# Altium schematic symbol library IC_ADI.SCHLIB: 3169 symbols (part 56 of 181) (continued)
## AD7533JP (continued)
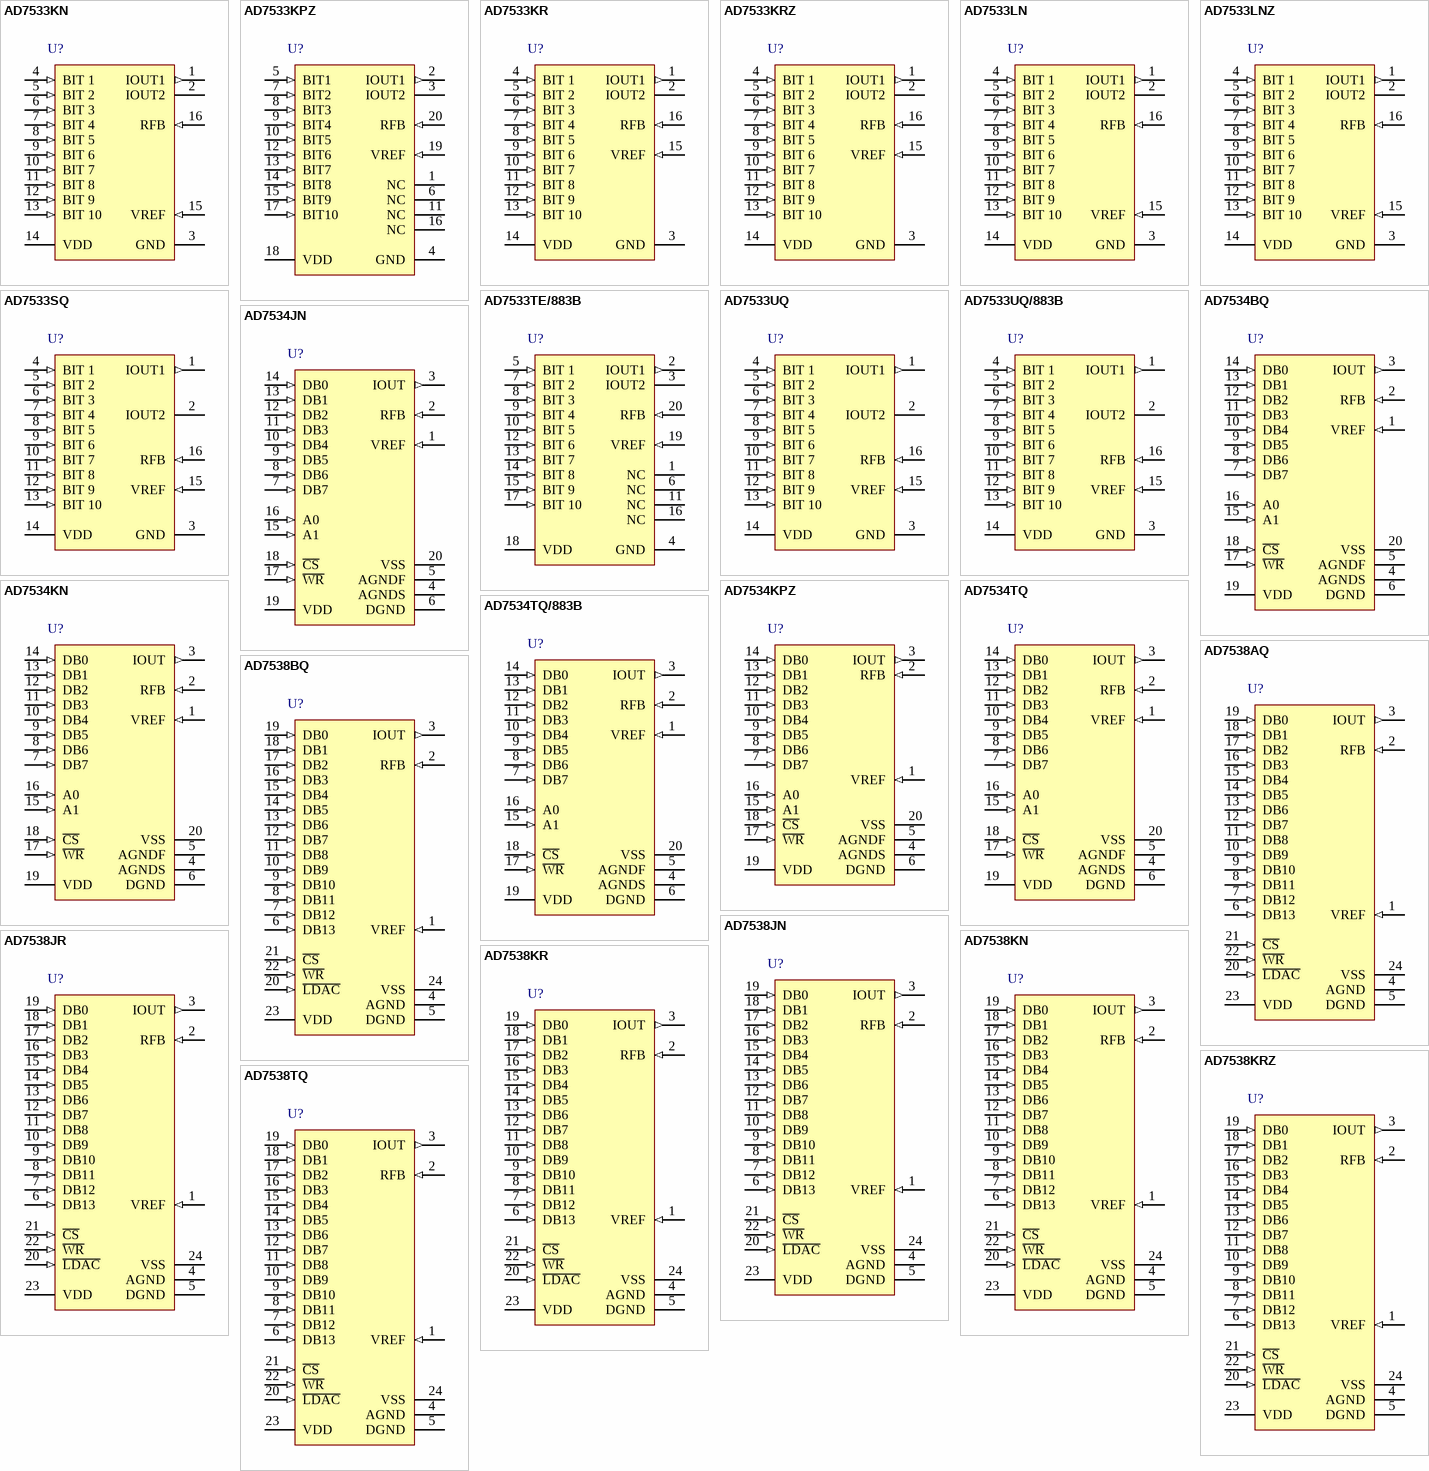
[diagram p47: symbols AD7533KN to AD7538TQ]

## AD7533KN
designator U?
Single 10-Bit CMOS Digital-to-Analog Converter, 0 to +70 degC, N-16, Tube; Generic Part Number: AD7533; PartNumber: AD7533KN; # DAC Outputs: 1; Max V+: 16.5V; Op Pwr Diss: 30mW; Resolution (Bits): 10; Settling Time: 600ns; Single Supply: Yes; DatasheetVersion: Rev.C; PackageVersion: 070706-A; PackageReference: N-16; PackageDescription: 16-Lead Plastic Dual In-Line Package [PDIP] Narrow Body; Supplier Part Number 1: AD7533KN-ND; Supplier Part Number 2: 584-AD7533KN; Packing: Tube; RoHS: N; Mounting Technology: Through Hole; Code_JEDEC: MS-001; ComponentLink1Description: Manufacturer URL; ComponentLink2Description: Datasheet; ComponentLink3Description: Package Specification; ComponentLink4Description: Product URL
footprint DIP16 (Footprint not found)
pins: 1 IOUT1 (out) "DAC Current Output.", 2 IOUT2 "DAC Analog Ground. This pin should normally be tied to the analog ground of the system.", 3 GND (power) "Ground.", 4 BIT 1 (in) "MSB to LSB.", 5 BIT 2 (in) "MSB to LSB.", 6 BIT 3 (in) "MSB to LSB.", 7 BIT 4 (in) "MSB to LSB.", 8 BIT 5 (in) "MSB to LSB.", 9 BIT 6 (in) "MSB to LSB.", 10 BIT 7 (in) "MSB to LSB.", 11 BIT 8 (in) "MSB to LSB.", 12 BIT 9 (in) "MSB to LSB.", 13 BIT 10 (in) "MSB to LSB.", 14 VDD (power) "Positive Power Supply Input. These parts can be operated from a supply of 5 V to 16 V.", 15 VREF (in) "DAC Reference Voltage Input Terminal.", 16 RFB (in) "DAC Feedback Resistor Pin. Establish voltage output for the DAC by connecting RFB to external amplifier output."

## AD7533KPZ
designator U?
Single 10-Bit CMOS Digital-to-Analog Converter, 0 to +70 degC, P-20A, Pb-Free, Tube; Generic Part Number: AD7533; PartNumber: AD7533KPZ; # DAC Outputs: 1; Max V+: 16.5V; Op Pwr Diss: 30mW; Resolution (Bits): 10; Settling Time: 600ns; Single Supply: Yes; DatasheetVersion: Rev.C; PackageVersion: Nov-2002; PackageReference: P-20A; PackageDescription: 20-Lead Plastic Leaded Chip Carrier [PLCC]; Supplier Part Number 1: AD7533KPZ-ND; Supplier Part Number 2: 584-AD7533KPZ; Packing: Tube; RoHS: Y; Mounting Technology: Surface Mount; Code_JEDEC: MO-047-AA; ComponentLink1Description: Manufacturer URL; ComponentLink2Description: Datasheet; ComponentLink3Description: Package Specification; ComponentLink4Description: Product URL
footprint PLCC-20N (Footprint not found)
pins: 1 NC "No Connect.", 2 IOUT1 (out) "DAC Current Output.", 3 IOUT2 "DAC Analog Ground. This pin should normally be tied to the analog ground of the system.", 4 GND (power) "Ground.", 5 BIT1 (in) "MSB to LSB.", 6 NC "No Connect.", 7 BIT2 (in) "MSB to LSB.", 8 BIT3 (in) "MSB to LSB.", 9 BIT4 (in) "MSB to LSB.", 10 BIT5 (in) "MSB to LSB.", 11 NC "No Connect.", 12 BIT6 (in) "MSB to LSB.", 13 BIT7 (in) "MSB to LSB.", 14 BIT8 (in) "MSB to LSB.", 15 BIT9 (in) "MSB to LSB.", 16 NC "No Connect.", 17 BIT10 (in) "MSB to LSB.", 18 VDD (power) "Positive Power Supply Input. These parts can be operated from a supply of 5 V to 16 V.", 19 VREF (in) "DAC Reference Voltage Input Terminal.", 20 RFB (in) "DAC Feedback Resistor Pin. Establish voltage output for the DAC by connecting RFB to external amplifier output."

## AD7533KR
designator U?
Single 10-Bit CMOS Digital-to-Analog Converter, 0 to +70 degC, RW-16, Tube; Generic Part Number: AD7533; PartNumber: AD7533KR; # DAC Outputs: 1; Max V+: 16.5V; Op Pwr Diss: 30mW; Resolution (Bits): 10; Settling Time: 600ns; Single Supply: Yes; DatasheetVersion: Rev.C; PackageVersion: 032707-B; PackageReference: RW-16; PackageDescription: 16-Lead Standard Small Outline Package [SOIC_W]; Supplier Part Number 1: AD7533KR-ND; Supplier Part Number 2: 584-AD7533KR; Packing: Tube; RoHS: N; Mounting Technology: Surface Mount; Code_JEDEC: MS-013-AA; Code_IPC: SOIC127P1030-16; ComponentLink1Description: Manufacturer URL; ComponentLink2Description: Datasheet; ComponentLink3Description: Package Specification; ComponentLink4Description: Product URL
footprint SOIC16W_1.27 (Footprint not found)
pins: 1 IOUT1 (out) "DAC Current Output.", 2 IOUT2 "DAC Analog Ground. This pin should normally be tied to the analog ground of the system.", 3 GND (power) "Ground.", 4 BIT 1 (in) "MSB to LSB.", 5 BIT 2 (in) "MSB to LSB.", 6 BIT 3 (in) "MSB to LSB.", 7 BIT 4 (in) "MSB to LSB.", 8 BIT 5 (in) "MSB to LSB.", 9 BIT 6 (in) "MSB to LSB.", 10 BIT 7 (in) "MSB to LSB.", 11 BIT 8 (in) "MSB to LSB.", 12 BIT 9 (in) "MSB to LSB.", 13 BIT 10 (in) "MSB to LSB.", 14 VDD (power) "Positive Power Supply Input. These parts can be operated from a supply of 5 V to 16 V.", 15 VREF (in) "DAC Reference Voltage Input Terminal.", 16 RFB (in) "DAC Feedback Resistor Pin. Establish voltage output for the DAC by connecting RFB to external amplifier output."

## AD7533KRZ
designator U?
Single 10-Bit CMOS Digital-to-Analog Converter, 0 to +70 degC, RW-16, Pb-Free, Tube; Generic Part Number: AD7533; PartNumber: AD7533KRZ; # DAC Outputs: 1; Max V+: 16.5V; Op Pwr Diss: 30mW; Resolution (Bits): 10; Settling Time: 600ns; Single Supply: Yes; DatasheetVersion: Rev.C; PackageVersion: 032707-B; PackageReference: RW-16; PackageDescription: 16-Lead Standard Small Outline Package [SOIC_W]; Supplier Part Number 1: AD7533KRZ-ND; Supplier Part Number 2: 88H0005; Supplier Part Number 3: 584-AD7533KRZ; Packing: Tube; RoHS: Y; Mounting Technology: Surface Mount; Code_JEDEC: MS-013-AA; Code_IPC: SOIC127P1030-16; ComponentLink1Description: Manufacturer URL; ComponentLink2Description: Datasheet; ComponentLink3Description: Package Specification; ComponentLink4Description: Product URL
footprint SOIC16W_1.27 (Footprint not found)
pins: 1 IOUT1 (out) "DAC Current Output.", 2 IOUT2 "DAC Analog Ground. This pin should normally be tied to the analog ground of the system.", 3 GND (power) "Ground.", 4 BIT 1 (in) "MSB to LSB.", 5 BIT 2 (in) "MSB to LSB.", 6 BIT 3 (in) "MSB to LSB.", 7 BIT 4 (in) "MSB to LSB.", 8 BIT 5 (in) "MSB to LSB.", 9 BIT 6 (in) "MSB to LSB.", 10 BIT 7 (in) "MSB to LSB.", 11 BIT 8 (in) "MSB to LSB.", 12 BIT 9 (in) "MSB to LSB.", 13 BIT 10 (in) "MSB to LSB.", 14 VDD (power) "Positive Power Supply Input. These parts can be operated from a supply of 5 V to 16 V.", 15 VREF (in) "DAC Reference Voltage Input Terminal.", 16 RFB (in) "DAC Feedback Resistor Pin. Establish voltage output for the DAC by connecting RFB to external amplifier output."

## AD7533LN
designator U?
Single 10-Bit CMOS Digital-to-Analog Converter, 0 to +70 degC, N-16, Tube; Generic Part Number: AD7533; PartNumber: AD7533LN; # DAC Outputs: 1; Max V+: 16.5V; Op Pwr Diss: 30mW; Resolution (Bits): 10; Settling Time: 600ns; Single Supply: Yes; DatasheetVersion: Rev.C; PackageVersion: 070706-A; PackageReference: N-16; PackageDescription: 16-Lead Plastic Dual In-Line Package [PDIP] Narrow Body; Supplier Part Number 1: AD7533LN-ND; Supplier Part Number 2: 584-AD7533LN; Packing: Tube; RoHS: N; Mounting Technology: Through Hole; Code_JEDEC: MS-001; ComponentLink1Description: Manufacturer URL; ComponentLink2Description: Datasheet; ComponentLink3Description: Package Specification; ComponentLink4Description: Product URL
footprint DIP16 (Footprint not found)
pins: 1 IOUT1 (out) "DAC Current Output.", 2 IOUT2 "DAC Analog Ground. This pin should normally be tied to the analog ground of the system.", 3 GND (power) "Ground.", 4 BIT 1 (in) "MSB to LSB.", 5 BIT 2 (in) "MSB to LSB.", 6 BIT 3 (in) "MSB to LSB.", 7 BIT 4 (in) "MSB to LSB.", 8 BIT 5 (in) "MSB to LSB.", 9 BIT 6 (in) "MSB to LSB.", 10 BIT 7 (in) "MSB to LSB.", 11 BIT 8 (in) "MSB to LSB.", 12 BIT 9 (in) "MSB to LSB.", 13 BIT 10 (in) "MSB to LSB.", 14 VDD (power) "Positive Power Supply Input. These parts can be operated from a supply of 5 V to 16 V.", 15 VREF (in) "DAC Reference Voltage Input Terminal.", 16 RFB (in) "DAC Feedback Resistor Pin. Establish voltage output for the DAC by connecting RFB to external amplifier output."

## AD7533LNZ
designator U?
Single 10-Bit CMOS Digital-to-Analog Converter, 0 to +70 degC, N-16, Pb-Free, Tube; Generic Part Number: AD7533; PartNumber: AD7533LNZ; # DAC Outputs: 1; Max V+: 16.5V; Op Pwr Diss: 30mW; Resolution (Bits): 10; Settling Time: 600ns; Single Supply: Yes; DatasheetVersion: Rev.C; PackageVersion: 070706-A; PackageReference: N-16; PackageDescription: 16-Lead Plastic Dual In-Line Package [PDIP] Narrow Body; Supplier Part Number 1: AD7533LNZ-ND; Supplier Part Number 2: 59K4981; Packing: Tube; RoHS: Y; Mounting Technology: Through Hole; Code_JEDEC: MS-001; ComponentLink1Description: Manufacturer URL; ComponentLink2Description: Datasheet; ComponentLink3Description: Package Specification; ComponentLink4Description: Product URL
footprint DIP16 (Footprint not found)
pins: 1 IOUT1 (out) "DAC Current Output.", 2 IOUT2 "DAC Analog Ground. This pin should normally be tied to the analog ground of the system.", 3 GND (power) "Ground.", 4 BIT 1 (in) "MSB to LSB.", 5 BIT 2 (in) "MSB to LSB.", 6 BIT 3 (in) "MSB to LSB.", 7 BIT 4 (in) "MSB to LSB.", 8 BIT 5 (in) "MSB to LSB.", 9 BIT 6 (in) "MSB to LSB.", 10 BIT 7 (in) "MSB to LSB.", 11 BIT 8 (in) "MSB to LSB.", 12 BIT 9 (in) "MSB to LSB.", 13 BIT 10 (in) "MSB to LSB.", 14 VDD (power) "Positive Power Supply Input. These parts can be operated from a supply of 5 V to 16 V.", 15 VREF (in) "DAC Reference Voltage Input Terminal.", 16 RFB (in) "DAC Feedback Resistor Pin. Establish voltage output for the DAC by connecting RFB to external amplifier output."

## AD7533SQ
designator U?
Single 10-Bit CMOS Digital-to-Analog Converter, -55 to +125 degC, Q-16, Tube; Generic Part Number: AD7533; PartNumber: AD7533SQ; # DAC Outputs: 1; Max V+: 16.5V; Op Pwr Diss: 30mW; Resolution (Bits): 10; Settling Time: 600ns; Single Supply: Yes; DatasheetVersion: Rev.C; PackageVersion: 1996; PackageReference: Q-16; PackageDescription: DIP, 16-Pin, Skinny Dual In-line Package, 300mil Wide, Pitch 2.54 mm; Supplier Part Number 1: AD7533SQ-ND; Supplier Part Number 2: 16F3381; Supplier Part Number 3: 584-AD7533SQ; Packing: Tube; RoHS: N; Mounting Technology: Through Hole; ComponentLink1Description: Manufacturer URL; ComponentLink2Description: Datasheet; ComponentLink3Description: Package Specification; ComponentLink4Description: Product URL
footprint DIP16 (Footprint not found)
pins: 1 IOUT1 (out) "DAC Current Output.", 2 IOUT2 "DAC Analog Ground. This pin should normally be tied to the analog ground of the system.", 3 GND (power) "Ground.", 4 BIT 1 (in) "MSB to LSB.", 5 BIT 2 (in) "MSB to LSB.", 6 BIT 3 (in) "MSB to LSB.", 7 BIT 4 (in) "MSB to LSB.", 8 BIT 5 (in) "MSB to LSB.", 9 BIT 6 (in) "MSB to LSB.", 10 BIT 7 (in) "MSB to LSB.", 11 BIT 8 (in) "MSB to LSB.", 12 BIT 9 (in) "MSB to LSB.", 13 BIT 10 (in) "MSB to LSB.", 14 VDD (power) "Positive Power Supply Input. These parts can be operated from a supply of 5 V to 16 V.", 15 VREF (in) "DAC Reference Voltage Input Terminal.", 16 RFB (in) "DAC Feedback Resistor Pin. Establish voltage output for the DAC by connecting RFB to external amplifier output."

## AD7533TE/883B
designator U?
Single 10-Bit CMOS Digital-to-Analog Converter, -55 to +125 degC, E-20-1, Tube; Generic Part Number: AD7533; PartNumber: AD7533TE/883B; # DAC Outputs: 1; Max V+: 16.5V; Op Pwr Diss: 30mW; Resolution (Bits): 10; Settling Time: 600ns; Single Supply: Yes; DatasheetVersion: Rev.C; PackageVersion: 022106-A; PackageReference: E-20-1; PackageDescription: 20-Terminal Ceramic Leadless Chip Carrier [LCC]; Supplier Part Number 1: 584-AD7533TE883B; Packing: Tube; RoHS: N; Mounting Technology: Surface Mount; ComponentLink1Description: Manufacturer URL; ComponentLink2Description: Datasheet; ComponentLink3Description: Package Specification; ComponentLink4Description: Product URL
footprint PLCC-20N (Footprint not found)
pins: 1 NC "No Connect.", 2 IOUT1 (out) "DAC Current Output.", 3 IOUT2 "DAC Analog Ground. This pin should normally be tied to the analog ground of the system.", 4 GND (power) "Ground.", 5 BIT 1 (in) "MSB to LSB.", 6 NC "No Connect.", 7 BIT 2 (in) "MSB to LSB.", 8 BIT 3 (in) "MSB to LSB.", 9 BIT 4 (in) "MSB to LSB.", 10 BIT 5 (in) "MSB to LSB.", 11 NC "No Connect.", 12 BIT 6 (in) "MSB to LSB.", 13 BIT 7 (in) "MSB to LSB.", 14 BIT 8 (in) "MSB to LSB.", 15 BIT 9 (in) "MSB to LSB.", 16 NC "No Connect.", 17 BIT 10 (in) "MSB to LSB.", 18 VDD (power) "Positive Power Supply Input. These parts can be operated from a supply of 5 V to 16 V.", 19 VREF (in) "DAC Reference Voltage Input Terminal.", 20 RFB (in) "DAC Feedback Resistor Pin. Establish voltage output for the DAC by connecting RFB to external amplifier output."

## AD7533UQ
designator U?
Single 10-Bit CMOS Digital-to-Analog Converter, -55 to +125 degC, Q-16, Tube; Generic Part Number: AD7533; PartNumber: AD7533UQ; # DAC Outputs: 1; Max V+: 16.5V; Op Pwr Diss: 30mW; Resolution (Bits): 10; Settling Time: 600ns; Single Supply: Yes; DatasheetVersion: Rev.C; PackageVersion: 1996; PackageReference: Q-16; PackageDescription: DIP, 16-Pin, Skinny Dual In-line Package, 300mil Wide, Pitch 2.54 mm; Supplier Part Number 1: AD7533UQ-ND; Supplier Part Number 2: 16F3383; Supplier Part Number 3: 584-AD7533UQ; Packing: Tube; RoHS: N; Mounting Technology: Through Hole; ComponentLink1Description: Manufacturer URL; ComponentLink2Description: Datasheet; ComponentLink3Description: Package Specification; ComponentLink4Description: Product URL
footprint DIP16 (Footprint not found)
pins: 1 IOUT1 (out) "DAC Current Output.", 2 IOUT2 "DAC Analog Ground. This pin should normally be tied to the analog ground of the system.", 3 GND (power) "Ground.", 4 BIT 1 (in) "MSB to LSB.", 5 BIT 2 (in) "MSB to LSB.", 6 BIT 3 (in) "MSB to LSB.", 7 BIT 4 (in) "MSB to LSB.", 8 BIT 5 (in) "MSB to LSB.", 9 BIT 6 (in) "MSB to LSB.", 10 BIT 7 (in) "MSB to LSB.", 11 BIT 8 (in) "MSB to LSB.", 12 BIT 9 (in) "MSB to LSB.", 13 BIT 10 (in) "MSB to LSB.", 14 VDD (power) "Positive Power Supply Input. These parts can be operated from a supply of 5 V to 16 V.", 15 VREF (in) "DAC Reference Voltage Input Terminal.", 16 RFB (in) "DAC Feedback Resistor Pin. Establish voltage output for the DAC by connecting RFB to external amplifier output."

## AD7533UQ/883B
designator U?
Single 10-Bit CMOS Digital-to-Analog Converter, -55 to +125 degC, Q-16, Tube; Generic Part Number: AD7533; PartNumber: AD7533UQ/883B; # DAC Outputs: 1; Max V+: 16.5V; Op Pwr Diss: 30mW; Resolution (Bits): 10; Settling Time: 600ns; Single Supply: Yes; DatasheetVersion: Rev.C; PackageVersion: 1996; PackageReference: Q-16; PackageDescription: DIP, 16-Pin, Skinny Dual In-line Package, 300mil Wide, Pitch 2.54 mm; Supplier Part Number 1: 30M2244; Supplier Part Number 2: 584-AD7533UQ883B; Packing: Tube; RoHS: N; Mounting Technology: Through Hole; ComponentLink1Description: Manufacturer URL; ComponentLink2Description: Datasheet; ComponentLink3Description: Package Specification; ComponentLink4Description: Product URL
footprint DIP16 (Footprint not found)
pins: 1 IOUT1 (out) "DAC Current Output.", 2 IOUT2 "DAC Analog Ground. This pin should normally be tied to the analog ground of the system.", 3 GND (power) "Ground.", 4 BIT 1 (in) "MSB to LSB.", 5 BIT 2 (in) "MSB to LSB.", 6 BIT 3 (in) "MSB to LSB.", 7 BIT 4 (in) "MSB to LSB.", 8 BIT 5 (in) "MSB to LSB.", 9 BIT 6 (in) "MSB to LSB.", 10 BIT 7 (in) "MSB to LSB.", 11 BIT 8 (in) "MSB to LSB.", 12 BIT 9 (in) "MSB to LSB.", 13 BIT 10 (in) "MSB to LSB.", 14 VDD (power) "Positive Power Supply Input. These parts can be operated from a supply of 5 V to 16 V.", 15 VREF (in) "DAC Reference Voltage Input Terminal.", 16 RFB (in) "DAC Feedback Resistor Pin. Establish voltage output for the DAC by connecting RFB to external amplifier output."

## AD7534BQ
designator U?
Single 14-Bit uP-Compatible Digital-to-Analog Converter, -25 to +125 degC, Q-20, Tube; Generic Part Number: AD7534; PartNumber: AD7534BQ; # DAC Outputs: 1; Max V+: 15.75V; Op Pwr Diss: 45mW; Resolution (Bits): 14; Settling Time: 1.5祍; Single Supply: No; DatasheetVersion: Rev.A; PackageVersion: Dec-2004; PackageReference: Q-20; PackageDescription: 20-Lead Ceramic Dual In-Line Package [CERDIP]; Supplier Part Number 1: AD7534BQ-ND; Supplier Part Number 2: 584-AD7534BQ; Packing: Tube; RoHS: N; Mounting Technology: Through Hole; ComponentLink1Description: Manufacturer URL; ComponentLink2Description: Datasheet; ComponentLink3Description: Package Specification; ComponentLink4Description: Product URL
footprint DIP20 (Footprint not found)
pins: 1 VREF (in) "Reference Input Voltage.", 2 RFB (in) "Feedback resistor.Used to close the loop around an external op-amp.", 3 IOUT (out) "Current Output Terminal.", 4 AGNDS (power) "Analog ground sense line;Reference point for external circuitry.This pin should  carry minimal current.", 5 AGNDF (power) "Analog ground force line;carries current from internal analog ground connections.AGNDF and AGNDS are tied together internally.", 6 DGND (power) "Digital Ground.", 7 DB7 (in) "Data Bit 7.", 8 DB6 (in) "Data Bit 6.", 9 DB5 (in) "Data Bit 5 or Data Bit 13 (DAC MSB).", 10 DB4 (in) "Data Bit 4 or Data Bit 12.", 11 DB3 (in) "Data Bit 3 or Data Bit 11.", 12 DB2 (in) "Data Bit 2 or Data Bit 10.", 13 DB1 (in) "Data Bit 1 or Data Bit 9.", 14 DB0 (in) "Data Bit 0 or Data Bit 8.", 15 A1 (in) "Address line 1.", 16 A0 (in) "Address line 0.", 17 ~{WR} (in) "Write input.Active low.", 18 ~{CS} (in) "Chip Select Input.Active low.", 19 VDD (power) "+12 Vto +15 V supply input.", 20 VSS (power) "Bias pin for High Temperature Low Leakage configuration.To implement low leakage system,the pin should be at a negative voltage.See Figures4,5 or 6 for recommended circuitry."

## AD7534JN
designator U?
Single 14-Bit uP-Compatible Digital-to-Analog Converter, 0 to +70 degC, N-20, Tube; Generic Part Number: AD7534; PartNumber: AD7534JN; # DAC Outputs: 1; Max V+: 15.75V; Op Pwr Diss: 45mW; Resolution (Bits): 14; Settling Time: 1.5祍; Single Supply: No; DatasheetVersion: Rev.A; PackageVersion: 070706-A; PackageReference: N-20; PackageDescription: 20-Lead Plastic Dual In-Line Package [PDIP] Narrow Body; Supplier Part Number 1: AD7534JN-ND; Supplier Part Number 2: 584-AD7534JN; Packing: Tube; RoHS: N; Mounting Technology: Through Hole; Code_JEDEC: MS-001; ComponentLink1Description: Manufacturer URL; ComponentLink2Description: Datasheet; ComponentLink3Description: Package Specification; ComponentLink4Description: Product URL
footprint DIP20 (Footprint not found)
pins: 1 VREF (in) "Reference Input Voltage", 2 RFB (in) "Feedback resistor. Used to close the loop around an external op-amp.", 3 IOUT (out) "Current Output Terminal", 4 AGNDS (power) "Analog ground sense line. Reference point for external circuitry. This pin should carry minimal current.", 5 AGNDF (power) "Analog ground force line; carries current from internal analog ground connections. AGNDF and AGNDS are tied together internally.", 6 DGND (power) "Digital Ground.", 7 DB7 (in) "Data Bit 7", 8 DB6 (in) "Data Bit 6", 9 DB5 (in) "Data Bit 5 or  Data Bit 13(DAC MSB)", 10 DB4 (in) "Data Bit 4 or  Data Bit 12", 11 DB3 (in) "Data Bit 3 or  Data Bit 11", 12 DB2 (in) "Data Bit 2 or  Data Bit 10", 13 DB1 (in) "Data Bit 1 or  Data Bit 9", 14 DB0 (in) "Data Bit 0 or  Data Bit 8", 15 A1 (in) "Address line 1", 16 A0 (in) "Address line 0", 17 ~{WR} (in) "Write input. Active low.", 18 ~{CS} (in) "Chip Select Input. Active low.", 19 VDD (power) "+12 V to +15 V supply input.", 20 VSS (power) "Bias pin for High Temperature Low Leakage configuration. To implement low leakage system, the pin should be at a negative voltage. See Figures 4,5 or 6 for recommended circuitry."

## AD7534KN
designator U?
Single 14-Bit uP-Compatible Digital-to-Analog Converter, 0 to +70 degC, N-20, Tube; Generic Part Number: AD7534; PartNumber: AD7534KN; # DAC Outputs: 1; Max V+: 15.75V; Op Pwr Diss: 45mW; Resolution (Bits): 14; Settling Time: 1.5祍; Single Supply: No; DatasheetVersion: Rev.A; PackageVersion: 070706-A; PackageReference: N-20; PackageDescription: 20-Lead Plastic Dual In-Line Package [PDIP] Narrow Body; Supplier Part Number 1: AD7534KN-ND; Supplier Part Number 2: 584-AD7534KN; Packing: Tube; RoHS: N; Mounting Technology: Through Hole; Code_JEDEC: MS-001; ComponentLink1Description: Manufacturer URL; ComponentLink2Description: Datasheet; ComponentLink3Description: Package Specification; ComponentLink4Description: Product URL
footprint DIP20 (Footprint not found)
pins: 1 VREF (in) "Reference Input Voltage", 2 RFB (in) "Feedback resistor. Used to close the loop around an external op-amp.", 3 IOUT (out) "Current Output Terminal", 4 AGNDS (power) "Analog ground sense line. Reference point for external circuitry. This pin should carry minimal current.", 5 AGNDF (power) "Analog ground force line; carries current from internal analog ground connections. AGNDF and AGNDS are tied together internally.", 6 DGND (power) "Digital Ground.", 7 DB7 (in) "Data Bit 7", 8 DB6 (in) "Data Bit 6", 9 DB5 (in) "Data Bit 5 or  Data Bit 13(DAC MSB)", 10 DB4 (in) "Data Bit 4 or  Data Bit 12", 11 DB3 (in) "Data Bit 3 or  Data Bit 11", 12 DB2 (in) "Data Bit 2 or  Data Bit 10", 13 DB1 (in) "Data Bit 1 or  Data Bit 9", 14 DB0 (in) "Data Bit 0 or  Data Bit 8", 15 A1 (in) "Address line 1", 16 A0 (in) "Address line 0", 17 ~{WR} (in) "Write input. Active low.", 18 ~{CS} (in) "Chip Select Input. Active low.", 19 VDD (power) "+12 V to +15 V supply input.", 20 VSS (power) "Bias pin for High Temperature Low Leakage configuration. To implement low leakage system, the pin should be at a negative voltage. See Figures 4,5 or 6 for recommended circuitry."

## AD7534KPZ
designator U?
Single 14-Bit uP-Compatible Digital-to-Analog Converter, 0 to +70 degC, P-20A, Pb-Free, Tube; Generic Part Number: AD7534; PartNumber: AD7534KPZ; # DAC Outputs: 1; Max V+: 15.75V; Op Pwr Diss: 45mW; Resolution (Bits): 14; Settling Time: 1.5祍; Single Supply: No; DatasheetVersion: Rev.A; PackageVersion: Nov-2002; PackageReference: P-20A; PackageDescription: 20-Lead Plastic Leaded Chip Carrier [PLCC]; Supplier Part Number 1: AD7534KPZ-ND; Supplier Part Number 2: 584-AD7534KPZ; Packing: Tube; RoHS: Y; Mounting Technology: Surface Mount; Code_JEDEC: MO-047-AA; ComponentLink1Description: Manufacturer URL; ComponentLink2Description: Datasheet; ComponentLink3Description: Package Specification; ComponentLink4Description: Product URL
footprint PLCC-20N (Footprint not found)
pins: 1 VREF (in) "Reference Input Voltage.", 2 RFB (in) "Feedback resistor.Used to close the loop around an external op-amp.", 3 IOUT (out) "Current Output Terminal.", 4 AGNDS (power) "Analog ground sense line.Reference point for external circuitry.This pin should carry minimal current.", 5 AGNDF (power) "Analog ground force line;carries current from internal analog ground connections.AGNDF and AGNDS are tied together internally.", 6 DGND (power) "Digital Ground.", 7 DB7 (in) "Data Bit 7.", 8 DB6 (in) "Data Bit 6.", 9 DB5 (in) "Data Bit 5 or Data Bit 13 (DAC MSB).", 10 DB4 (in) "Data Bit 4 or Data Bit 12.", 11 DB3 (in) "Data Bit 3 or Data Bit 11.", 12 DB2 (in) "Data Bit 2 or Data Bit 10.", 13 DB1 (in) "Data Bit 1 or Data Bit 9.", 14 DB0 (in) "Data Bit 0 or Data Bit 8.", 15 A1 (in) "Address line 1.", 16 A0 (in) "Address line 0.", 17 ~{WR} (in) "Write input.Active low.", 18 ~{CS} (in) "Chip Select Input.Active low.", 19 VDD (power) "+ 12V to +15V supply input.", 20 VSS (power) "Bias pin for High Temperature Low Leakage configuration.To implement low leakage system,the pin should be at a negative voltage.See Figures 4,5 or 6 for recommended circuitry."

## AD7534TQ
designator U?
Single 14-Bit uP-Compatible Digital-to-Analog Converter, -55 to +125 degC, Q-20, Tube; Generic Part Number: AD7534; PartNumber: AD7534TQ; # DAC Outputs: 1; Max V+: 15.75V; Op Pwr Diss: 45mW; Resolution (Bits): 14; Settling Time: 1.5祍; Single Supply: No; DatasheetVersion: Rev.A; PackageVersion: Dec-2004; PackageReference: Q-20; PackageDescription: 20-Lead Ceramic Dual In-Line Package [CERDIP]; Supplier Part Number 1: AD7534TQ-ND; Supplier Part Number 2: 584-AD7534TQ; Packing: Tube; RoHS: N; Mounting Technology: Through Hole; ComponentLink1Description: Manufacturer URL; ComponentLink2Description: Datasheet; ComponentLink3Description: Package Specification; ComponentLink4Description: Product URL
footprint DIP20 (Footprint not found)
pins: 1 VREF (in) "Reference Input Voltage.", 2 RFB (in) "Feedback resistor.Used to close the loop around an external op-amp.", 3 IOUT (out) "Current Output Terminal.", 4 AGNDS (power) "Analog ground sense line;Reference point for external circuitry.This pin should  carry minimal current.", 5 AGNDF (power) "Analog ground force line;carries current from internal analog ground connections.AGNDF and AGNDS are tied together internally.", 6 DGND (power) "Digital Ground.", 7 DB7 (in) "Data Bit 7.", 8 DB6 (in) "Data Bit 6.", 9 DB5 (in) "Data Bit 5 or Data Bit 13 (DAC MSB).", 10 DB4 (in) "Data Bit 4 or Data Bit 12.", 11 DB3 (in) "Data Bit 3 or Data Bit 11.", 12 DB2 (in) "Data Bit 2 or Data Bit 10.", 13 DB1 (in) "Data Bit 1 or Data Bit 9.", 14 DB0 (in) "Data Bit 0 or Data Bit 8.", 15 A1 (in) "Address line 1.", 16 A0 (in) "Address line 0.", 17 ~{WR} (in) "Write input.Active low.", 18 ~{CS} (in) "Chip Select Input.Active low.", 19 VDD (power) "+12 Vto +15 V supply input.", 20 VSS (power) "Bias pin for High Temperature Low Leakage configuration.To implement low leakage system,the pin should be at a negative voltage.See Figures4,5 or 6 for recommended circuitry."

## AD7534TQ/883B
designator U?
Single 14-Bit uP-Compatible Digital-to-Analog Converter, -55 to +125 degC, Q-20, Tube; Generic Part Number: AD7534; PartNumber: AD7534TQ/883B; # DAC Outputs: 1; Max V+: 15.75V; Op Pwr Diss: 45mW; Resolution (Bits): 14; Settling Time: 1.5祍; Single Supply: No; DatasheetVersion: Rev.A; PackageVersion: Dec-2004; PackageReference: Q-20; PackageDescription: 20-Lead Ceramic Dual In-Line Package [CERDIP]; Supplier Part Number 1: 584-AD7534TQ883B; Packing: Tube; RoHS: N; Mounting Technology: Through Hole; ComponentLink1Description: Manufacturer URL; ComponentLink2Description: Datasheet; ComponentLink3Description: Package Specification; ComponentLink4Description: Product URL
footprint DIP20 (Footprint not found)
pins: 1 VREF (in) "Reference Input Voltage.", 2 RFB (in) "Feedback resistor.Used to close the loop around an external op-amp.", 3 IOUT (out) "Current Output Terminal.", 4 AGNDS (power) "Analog ground sense line;Reference point for external circuitry.This pin should  carry minimal current.", 5 AGNDF (power) "Analog ground force line;carries current from internal analog ground connections.AGNDF and AGNDS are tied together internally.", 6 DGND (power) "Digital Ground.", 7 DB7 (in) "Data Bit 7.", 8 DB6 (in) "Data Bit 6.", 9 DB5 (in) "Data Bit 5 or Data Bit 13 (DAC MSB).", 10 DB4 (in) "Data Bit 4 or Data Bit 12.", 11 DB3 (in) "Data Bit 3 or Data Bit 11.", 12 DB2 (in) "Data Bit 2 or Data Bit 10.", 13 DB1 (in) "Data Bit 1 or Data Bit 9.", 14 DB0 (in) "Data Bit 0 or Data Bit 8.", 15 A1 (in) "Address line 1.", 16 A0 (in) "Address line 0.", 17 ~{WR} (in) "Write input.Active low.", 18 ~{CS} (in) "Chip Select Input.Active low.", 19 VDD (power) "+12 Vto +15 V supply input.", 20 VSS (power) "Bias pin for High Temperature Low Leakage configuration.To implement low leakage system,the pin should be at a negative voltage.See Figures4,5 or 6 for recommended circuitry."

## AD7538AQ
designator U?
Single 14-Bit LC2MOS Microprocessor-Compatible Digital-to-Analog Converter, -25 to +85 degC, Q-24-1, Tube; Generic Part Number: AD7538; PartNumber: AD7538AQ; # DAC Outputs: 1; Max V+: 15.75V; Op Pwr Diss: 60mW; Resolution (Bits): 14; Settling Time: 1.5祍; Single Supply: No; DatasheetVersion: Rev.B; PackageVersion: 100808-A; PackageReference: Q-24-1; PackageDescription: 24-Lead Ceramic Dual In-Line Package [CERDIP]; Supplier Part Number 1: AD7538AQ-ND; Supplier Part Number 2: 584-AD7538AQ; Packing: Tube; RoHS: N; Mounting Technology: Through Hole; ComponentLink1Description: Manufacturer URL; ComponentLink2Description: Datasheet; ComponentLink3Description: Package Specification; ComponentLink4Description: Product URL
footprint DIP24 (Footprint not found)
pins: 1 VREF (in) "Voltage Reference.", 2 RFB (in) "Feedback Resistor. Used to close the loop around an external op amp.", 3 IOUT (out) "Current Output Terminal.", 4 AGND (power) "Analog Ground", 5 DGND (power) "Digital Ground.", 6 DB13 (in) "Data Input. Bit DB13 (MSB).", 7 DB12 (in) "Data Input.", 8 DB11 (in) "Data Input.", 9 DB10 (in) "Data Input.", 10 DB9 (in) "Data Input.", 11 DB8 (in) "Data Input.", 12 DB7 (in) "Data Input.", 13 DB6 (in) "Data Input.", 14 DB5 (in) "Data Input.", 15 DB4 (in) "Data Input.", 16 DB3 (in) "Data Input.", 17 DB2 (in) "Data Input.", 18 DB1 (in) "Data Input.", 19 DB0 (in) "Data Input. Bit DB0 (LSB).", 20 ~{LDAC} (in) "Chip Select Input. Active low.", 21 ~{CS} (in) "Asynchronous Load DAC Input. Active low.", 22 ~{WR} (in) "Write Input. Active low.", 23 VDD (power) "+12 V to +15 V Supply Input.", 24 VSS (power) "Bias pin for high temperature low leakage configuration. To implement low leakage system, the pin should be at a negative voltage. See Figure 6 and Figure 8 for recommended circuitry."

## AD7538BQ
designator U?
Single 14-Bit LC2MOS Microprocessor-Compatible Digital-to-Analog Converter, -25 to +85 degC, Q-24-1, Tube; Generic Part Number: AD7538; PartNumber: AD7538BQ; # DAC Outputs: 1; Max V+: 15.75V; Op Pwr Diss: 60mW; Resolution (Bits): 14; Settling Time: 1.5祍; Single Supply: No; DatasheetVersion: Rev.B; PackageVersion: 100808-A; PackageReference: Q-24-1; PackageDescription: 24-Lead Ceramic Dual In-Line Package [CERDIP]; Supplier Part Number 1: AD7538BQ-ND; Supplier Part Number 2: 584-AD7538BQ; Packing: Tube; RoHS: N; Mounting Technology: Through Hole; ComponentLink1Description: Manufacturer URL; ComponentLink2Description: Datasheet; ComponentLink3Description: Package Specification; ComponentLink4Description: Product URL
footprint DIP24 (Footprint not found)
pins: 1 VREF (in) "Voltage Reference.", 2 RFB (in) "Feedback Resistor. Used to close the loop around an external op amp.", 3 IOUT (out) "Current Output Terminal.", 4 AGND (power) "Analog Ground", 5 DGND (power) "Digital Ground.", 6 DB13 (in) "Data Input. Bit DB13 (MSB).", 7 DB12 (in) "Data Input.", 8 DB11 (in) "Data Input.", 9 DB10 (in) "Data Input.", 10 DB9 (in) "Data Input.", 11 DB8 (in) "Data Input.", 12 DB7 (in) "Data Input.", 13 DB6 (in) "Data Input.", 14 DB5 (in) "Data Input.", 15 DB4 (in) "Data Input.", 16 DB3 (in) "Data Input.", 17 DB2 (in) "Data Input.", 18 DB1 (in) "Data Input.", 19 DB0 (in) "Data Input. Bit DB0 (LSB).", 20 ~{LDAC} (in) "Chip Select Input. Active low.", 21 ~{CS} (in) "Asynchronous Load DAC Input. Active low.", 22 ~{WR} (in) "Write Input. Active low.", 23 VDD (power) "+12 V to +15 V Supply Input.", 24 VSS (power) "Bias pin for high temperature low leakage configuration. To implement low leakage system, the pin should be at a negative voltage. See Figure 6 and Figure 8 for recommended circuitry."

## AD7538JN
designator U?
Single 14-Bit LC2MOS Microprocessor-Compatible Digital-to-Analog Converter, 0 to +70 degC, N-24-1, Tube; Generic Part Number: AD7538; PartNumber: AD7538JN; # DAC Outputs: 1; Max V+: 15.75V; Op Pwr Diss: 60mW; Resolution (Bits): 14; Settling Time: 1.5祍; Single Supply: No; DatasheetVersion: Rev.B; PackageVersion: 071006-A; PackageReference: N-24-1; PackageDescription: 24-Lead Plastic Dual In-Line Package [PDIP] Narrow Body; Supplier Part Number 1: AD7538JN-ND; Supplier Part Number 2: 584-AD7538JN; Packing: Tube; RoHS: N; Mounting Technology: Through Hole; Code_JEDEC: MS-001; ComponentLink1Description: Manufacturer URL; ComponentLink2Description: Datasheet; ComponentLink3Description: Package Specification; ComponentLink4Description: Product URL
footprint DIP24 (Footprint not found)
pins: 1 VREF (in) "Voltage Reference.", 2 RFB (in) "Feedback Resistor. Used to close the loop around an external op amp.", 3 IOUT (out) "Current Output Terminal.", 4 AGND (power) "Analog Ground", 5 DGND (power) "Digital Ground.", 6 DB13 (in) "Data Input. Bit DB13 (MSB).", 7 DB12 (in) "Data Input.", 8 DB11 (in) "Data Input.", 9 DB10 (in) "Data Input.", 10 DB9 (in) "Data Input.", 11 DB8 (in) "Data Input.", 12 DB7 (in) "Data Input.", 13 DB6 (in) "Data Input.", 14 DB5 (in) "Data Input.", 15 DB4 (in) "Data Input.", 16 DB3 (in) "Data Input.", 17 DB2 (in) "Data Input.", 18 DB1 (in) "Data Input.", 19 DB0 (in) "Data Input. Bit DB0 (LSB).", 20 ~{LDAC} (in) "Chip Select Input. Active low.", 21 ~{CS} (in) "Asynchronous Load DAC Input. Active low.", 22 ~{WR} (in) "Write Input. Active low.", 23 VDD (power) "+12 V to +15 V Supply Input.", 24 VSS (power) "Bias pin for high temperature low leakage configuration. To implement low leakage system, the pin should be at a negative voltage. See Figure 6 and Figure 8 for recommended circuitry."

## AD7538JR
designator U?
Single 14-Bit LC2MOS Microprocessor-Compatible Digital-to-Analog Converter, 0 to +70 degC, RW-24, Tube; Generic Part Number: AD7538; PartNumber: AD7538JR; # DAC Outputs: 1; Max V+: 15.75V; Op Pwr Diss: 60mW; Resolution (Bits): 14; Settling Time: 1.5祍; Single Supply: No; DatasheetVersion: Rev.B; PackageVersion: 060706-A; PackageReference: RW-24; PackageDescription: 24-Lead Standard Small Outline Package [SOIC_W]; Supplier Part Number 1: AD7538JR-ND; Supplier Part Number 2: 584-AD7538JR; Packing: Tube; RoHS: N; Mounting Technology: Surface Mount; Code_JEDEC: MS-013-AD; ComponentLink1Description: Manufacturer URL; ComponentLink2Description: Datasheet; ComponentLink3Description: Package Specification; ComponentLink4Description: Product URL
footprint SOIC24W_1.27 (Footprint not found)
pins: 1 VREF (in) "Voltage Reference.", 2 RFB (in) "Feedback Resistor. Used to close the loop around an external op amp.", 3 IOUT (out) "Current Output Terminal.", 4 AGND (power) "Analog Ground", 5 DGND (power) "Digital Ground.", 6 DB13 (in) "Data Input. Bit DB13 (MSB).", 7 DB12 (in) "Data Input.", 8 DB11 (in) "Data Input.", 9 DB10 (in) "Data Input.", 10 DB9 (in) "Data Input.", 11 DB8 (in) "Data Input.", 12 DB7 (in) "Data Input.", 13 DB6 (in) "Data Input.", 14 DB5 (in) "Data Input.", 15 DB4 (in) "Data Input.", 16 DB3 (in) "Data Input.", 17 DB2 (in) "Data Input.", 18 DB1 (in) "Data Input.", 19 DB0 (in) "Data Input. Bit DB0 (LSB).", 20 ~{LDAC} (in) "Chip Select Input. Active low.", 21 ~{CS} (in) "Asynchronous Load DAC Input. Active low.", 22 ~{WR} (in) "Write Input. Active low.", 23 VDD (power) "+12 V to +15 V Supply Input.", 24 VSS (power) "Bias pin for high temperature low leakage configuration. To implement low leakage system, the pin should be at a negative voltage. See Figure 6 and Figure 8 for recommended circuitry."

## AD7538KN
designator U?
Single 14-Bit LC2MOS Microprocessor-Compatible Digital-to-Analog Converter, 0 to +70 degC, N-24-1, Tube; Generic Part Number: AD7538; PartNumber: AD7538KN; # DAC Outputs: 1; Max V+: 15.75V; Op Pwr Diss: 60mW; Resolution (Bits): 14; Settling Time: 1.5祍; Single Supply: No; DatasheetVersion: Rev.B; PackageVersion: 071006-A; PackageReference: N-24-1; PackageDescription: 24-Lead Plastic Dual In-Line Package [PDIP] Narrow Body; Supplier Part Number 1: AD7538KN-ND; Supplier Part Number 2: 584-AD7538KN; Packing: Tube; RoHS: N; Mounting Technology: Through Hole; Code_JEDEC: MS-001; ComponentLink1Description: Manufacturer URL; ComponentLink2Description: Datasheet; ComponentLink3Description: Package Specification; ComponentLink4Description: Product URL
footprint DIP24 (Footprint not found)
pins: 1 VREF (in) "Voltage Reference.", 2 RFB (in) "Feedback Resistor. Used to close the loop around an external op amp.", 3 IOUT (out) "Current Output Terminal.", 4 AGND (power) "Analog Ground", 5 DGND (power) "Digital Ground.", 6 DB13 (in) "Data Input. Bit DB13 (MSB).", 7 DB12 (in) "Data Input.", 8 DB11 (in) "Data Input.", 9 DB10 (in) "Data Input.", 10 DB9 (in) "Data Input.", 11 DB8 (in) "Data Input.", 12 DB7 (in) "Data Input.", 13 DB6 (in) "Data Input.", 14 DB5 (in) "Data Input.", 15 DB4 (in) "Data Input.", 16 DB3 (in) "Data Input.", 17 DB2 (in) "Data Input.", 18 DB1 (in) "Data Input.", 19 DB0 (in) "Data Input. Bit DB0 (LSB).", 20 ~{LDAC} (in) "Chip Select Input. Active low.", 21 ~{CS} (in) "Asynchronous Load DAC Input. Active low.", 22 ~{WR} (in) "Write Input. Active low.", 23 VDD (power) "+12 V to +15 V Supply Input.", 24 VSS (power) "Bias pin for high temperature low leakage configuration. To implement low leakage system, the pin should be at a negative voltage. See Figure 6 and Figure 8 for recommended circuitry."

## AD7538KR
designator U?
Single 14-Bit LC2MOS Microprocessor-Compatible Digital-to-Analog Converter, 0 to +70 degC, RW-24, Tube; Generic Part Number: AD7538; PartNumber: AD7538KR; # DAC Outputs: 1; Max V+: 15.75V; Op Pwr Diss: 60mW; Resolution (Bits): 14; Settling Time: 1.5祍; Single Supply: No; DatasheetVersion: Rev.B; PackageVersion: 060706-A; PackageReference: RW-24; PackageDescription: 24-Lead Standard Small Outline Package [SOIC_W]; Supplier Part Number 1: AD7538KR-ND; Supplier Part Number 2: 584-AD7538KR; Packing: Tube; RoHS: N; Mounting Technology: Surface Mount; Code_JEDEC: MS-013-AD; ComponentLink1Description: Manufacturer URL; ComponentLink2Description: Datasheet; ComponentLink3Description: Package Specification; ComponentLink4Description: Product URL
footprint SOIC24W_1.27 (Footprint not found)
pins: 1 VREF (in) "Voltage Reference.", 2 RFB (in) "Feedback Resistor. Used to close the loop around an external op amp.", 3 IOUT (out) "Current Output Terminal.", 4 AGND (power) "Analog Ground", 5 DGND (power) "Digital Ground.", 6 DB13 (in) "Data Input. Bit DB13 (MSB).", 7 DB12 (in) "Data Input.", 8 DB11 (in) "Data Input.", 9 DB10 (in) "Data Input.", 10 DB9 (in) "Data Input.", 11 DB8 (in) "Data Input.", 12 DB7 (in) "Data Input.", 13 DB6 (in) "Data Input.", 14 DB5 (in) "Data Input.", 15 DB4 (in) "Data Input.", 16 DB3 (in) "Data Input.", 17 DB2 (in) "Data Input.", 18 DB1 (in) "Data Input.", 19 DB0 (in) "Data Input. Bit DB0 (LSB).", 20 ~{LDAC} (in) "Chip Select Input. Active low.", 21 ~{CS} (in) "Asynchronous Load DAC Input. Active low.", 22 ~{WR} (in) "Write Input. Active low.", 23 VDD (power) "+12 V to +15 V Supply Input.", 24 VSS (power) "Bias pin for high temperature low leakage configuration. To implement low leakage system, the pin should be at a negative voltage. See Figure 6 and Figure 8 for recommended circuitry."

## AD7538KRZ
designator U?
Single 14-Bit LC2MOS Microprocessor-Compatible Digital-to-Analog Converter, 0 to +70 degC, RW-24, Pb-Free, Tube; Generic Part Number: AD7538; PartNumber: AD7538KRZ; # DAC Outputs: 1; Max V+: 15.75V; Op Pwr Diss: 60mW; Resolution (Bits): 14; Settling Time: 1.5祍; Single Supply: No; DatasheetVersion: Rev.B; PackageVersion: 060706-A; PackageReference: RW-24; PackageDescription: 24-Lead Standard Small Outline Package [SOIC_W]; Supplier Part Number 1: AD7538KRZ-ND; Supplier Part Number 2: 584-AD7538KRZ; Packing: Tube; RoHS: Y; Mounting Technology: Surface Mount; Code_JEDEC: MS-013-AD; ComponentLink1Description: Manufacturer URL; ComponentLink2Description: Datasheet; ComponentLink3Description: Package Specification; ComponentLink4Description: Product URL
footprint SOIC24W_1.27 (Footprint not found)
pins: 1 VREF (in) "Voltage Reference.", 2 RFB (in) "Feedback Resistor. Used to close the loop around an external op amp.", 3 IOUT (out) "Current Output Terminal.", 4 AGND (power) "Analog Ground", 5 DGND (power) "Digital Ground.", 6 DB13 (in) "Data Input. Bit DB13 (MSB).", 7 DB12 (in) "Data Input.", 8 DB11 (in) "Data Input.", 9 DB10 (in) "Data Input.", 10 DB9 (in) "Data Input.", 11 DB8 (in) "Data Input.", 12 DB7 (in) "Data Input.", 13 DB6 (in) "Data Input.", 14 DB5 (in) "Data Input.", 15 DB4 (in) "Data Input.", 16 DB3 (in) "Data Input.", 17 DB2 (in) "Data Input.", 18 DB1 (in) "Data Input.", 19 DB0 (in) "Data Input. Bit DB0 (LSB).", 20 ~{LDAC} (in) "Chip Select Input. Active low.", 21 ~{CS} (in) "Asynchronous Load DAC Input. Active low.", 22 ~{WR} (in) "Write Input. Active low.", 23 VDD (power) "+12 V to +15 V Supply Input.", 24 VSS (power) "Bias pin for high temperature low leakage configuration. To implement low leakage system, the pin should be at a negative voltage. See Figure 6 and Figure 8 for recommended circuitry."